# Altium integrated library BYTECH_HW_LIB_2019.IntLib: 907 symbols (part 6 of 6)
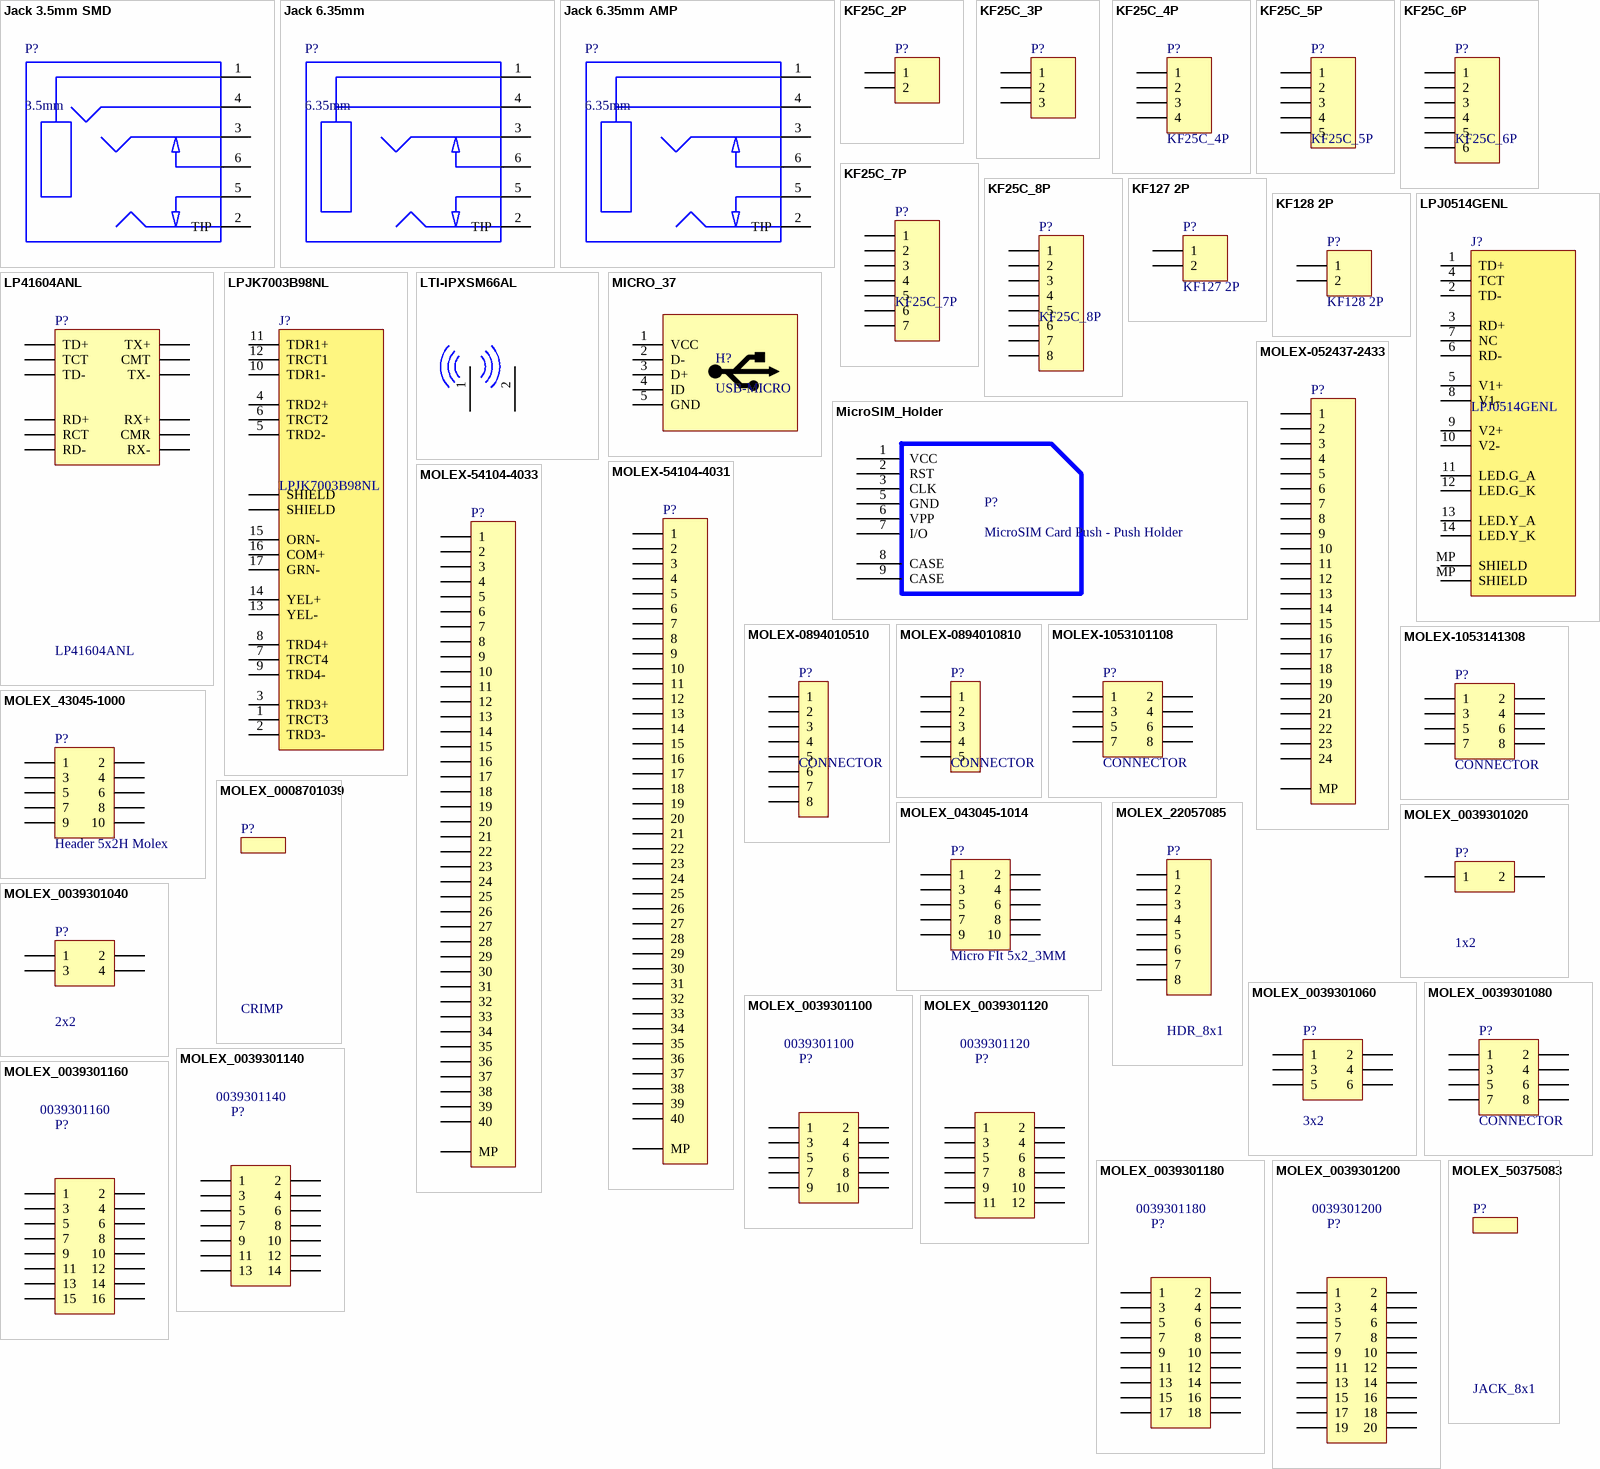
[diagram p44: symbols Jack 3.5mm SMD to MOLEX_50375083]

## MOLEX_0039301060
designator P?, comment 3x2
CONN HEADER R/A 6POS 4.2MM; MFR: MOLEX; MPN: 0039301060; Solder: WAVE; Value: 0039301060
signal-integrity model Connector
footprint CON3X2ANGLE
pins: 1, 2, 3, 4, 5, 6

## MOLEX_0039301080
designator P?, comment CONNECTOR
CONN HEADER R/A 8POS 4.2MM; MFR: MOLEX; MPN: 0039301080; Solder: WAVE; Value: 0039301080
footprint CON4x2Angle
pins: 1, 2, 3, 4, 5, 6, 7, 8

## MOLEX_0039301100
designator P?, comment 0039301100
CONN HEADER R/A 10POS 4.2MM; MFR: MOLEX; Rule: PcbType=ProtelPcb; Solder: WAVE; MPN: 0039301100; Value: 0039301100
footprint CON5x2Angle
pins: 1, 2, 3, 4, 5, 6, 7, 8, 9, 10

## MOLEX_0039301120
designator P?, comment 0039301120
CONN HEADER R/A 12POS 4.2MM; MFR: MOLEX; Rule: PcbType=ProtelPcb; Solder: WAVE; MPN: 0039301120; Value: 0039301120
footprint CON6x2Angle
pins: 1, 2, 3, 4, 5, 6, 7, 8, 9, 10, 11, 12

## MOLEX_0039301140
designator P?, comment 0039301140
CONN HEADER R/A 14POS 4.2MM; MFR: MOLEX; Rule: PcbType=ProtelPcb; Solder: WAVE; MPN: 0039301140; Value: 0039301140
footprint CON7x2Angle (Footprint not found)
pins: 1, 2, 3, 4, 5, 6, 7, 8, 9, 10, 11, 12, 13, 14

## MOLEX_0039301160
designator P?, comment 0039301160
CONN HEADER R/A 16POS 4.2MM; MFR: MOLEX; Rule: PcbType=ProtelPcb; Solder: WAVE; MPN: 0039301160; Value: 0039301160
footprint CON8x2Angle (Footprint not found)
pins: 1, 2, 3, 4, 5, 6, 7, 8, 9, 10, 11, 12, 13, 14, 15, 16

## MOLEX_0039301180
designator P?, comment 0039301180
CONN HEADER R/A 18POS 4.2MM; MFR: MOLEX; Rule: PcbType=ProtelPcb; Solder: WAVE; MPN: 0039301180; Value: 0039301180
footprint CON9x2Angle (Footprint not found)
pins: 1, 2, 3, 4, 5, 6, 7, 8, 9, 10, 11, 12, 13, 14, 15, 16, 17, 18

## MOLEX_0039301200
designator P?, comment 0039301200
CONN HEADER R/A 20POS 4.2MM; MFR: MOLEX; Rule: PcbType=ProtelPcb; Solder: WAVE; MPN: 0039301200; Value: 0039301200
footprint CON10x2Angle (Footprint not found)
pins: 1, 2, 3, 4, 5, 6, 7, 8, 9, 10, 11, 12, 13, 14, 15, 16, 17, 18, 19, 20

## MOLEX_50375083
designator P?, comment JACK_8x1  (mechanical)
CONN HOUSING 8POS 2.5MM SHROUD / (used for 2205-7085); MFR: Molex; MPN: 50375083; Solder: HAND

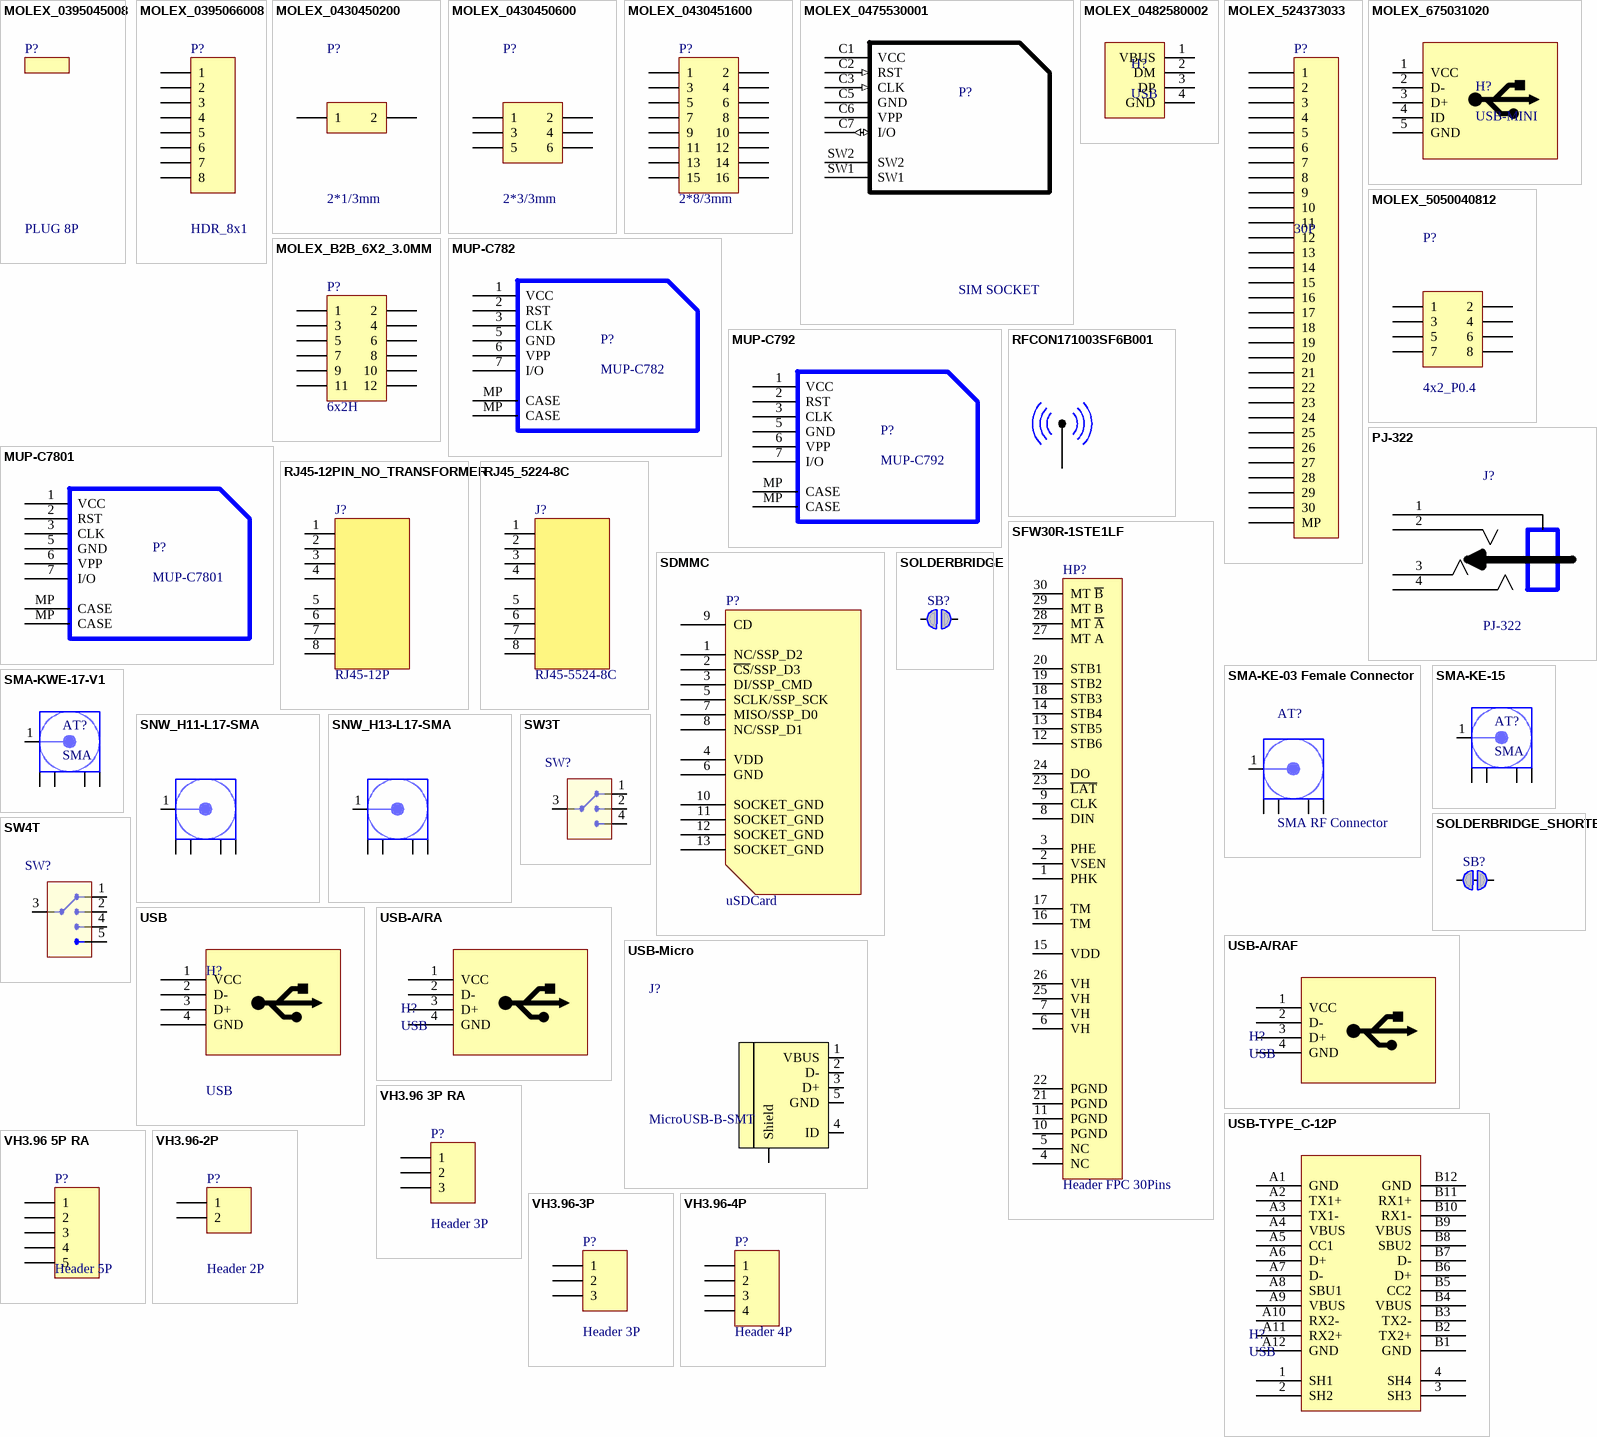
[diagram p34: symbols MOLEX_0395045008 to VH3.96-4P]

## MOLEX_0395045008
designator P?, comment PLUG 8P  (mechanical)
TERM BLOCK PLUG 8POS STR 3.5MM / (used with 0395066008); MFR: Molex; MPN: 0395045008; Solder: MAN

## MOLEX_0395066008
designator P?, comment HDR_8x1
TERM BLOCK HDR 8POS 90DEG 3.5MM; MFR: Molex; MPN: 0395066008; Solder: WAVE
footprint MOLEX_0395066008 (Footprint not found)
pins: 1, 2, 3, 4, 5, 6, 7, 8

## MOLEX_0430450200
designator P?, comment 2*1/3mm
CONN RECEPT 2POS 3mm DUAL ROW; MPN: 0430450200; Solder: WAVE; Value: 2*1/3mm
footprint HDR_1x2_3.0MM
pins: 1, 2

## MOLEX_0430450600
designator P?, comment 2*3/3mm
CONN RECEPT 6POS 3mm DUAL ROW; MPN: 0430450600; Solder: WAVE; Value: 2*3/3mm
footprint HDR_3x2_3.0MM
pins: 1, 2, 3, 4, 5, 6

## MOLEX_0430451600
designator P?, comment 2*8/3mm
CONN RECEPT 16POS 3mm DUAL ROW; MPN: 0430451600; Solder: WAVE; CompanyID: VT-00132; Value: 2*8/3mm
footprint HDR_8X2_3.0MM
pins: 1, 2, 3, 4, 5, 6, 7, 8, 9, 10, 11, 12, 13, 14, 15, 16

## MOLEX_0475530001
designator P?, comment SIM SOCKET
8 (6 + 2) Position Card CONN SIM/SAM CARD PUSH-PULL R/A; MPN: 0475530001; Solder: SMT; CompanyID: VT-01186; Value: SIM SOCKET
footprint 0475530001 (Footprint not found)
pins: C1 VCC (power), C2 RST (in), C3 CLK (in), C5 GND (power), C6 VPP, C7 I/O (io), SW1, SW2

## MOLEX_0482580002
designator H?, comment USB
CONN HEADER RCPT USB 4POS RT ANG T/H; MPN: 482580002; Solder: WAVE; Value: USB
footprint USB_482580002
pins: 1 VBUS, 2 DM, 3 DP, 4 GND

## MOLEX_524373033
designator P?, comment 30P
CONN FFC BOTTOM 30POS 0.50MM R/A; MFR: MOLEX; MPN: 0524373033; Solder: SMT; Value: 30P
footprint MOLEX_0524373033 (Footprint not found)
pins: 0 MP, 1, 2, 3, 4, 5, 6, 7, 8, 9, 10, 11, 12, 13, 14, 15, 16, 17, 18, 19, 20, 21, 22, 23, 24, 25, 26, 27, 28, 29, 30

## MOLEX_675031020
designator H?, comment USB-MINI
CONN RECEPT MINI USB R/A 5POS SMD; MPN: 675031020; Solder: SMT; CompanyID: VT-00344; Value: USB-MINI
footprint USB-Mini
pins: 1 VCC, 2 D-, 3 D+, 4 ID, 5 GND

## MOLEX_5050040812
designator P?, comment 4x2_P0.4
RECP ASSY B-B 0.4 8CKT TP; MPN: 5050040812; Solder: SMT; Value: 4x2_P0.4
footprint 5050040812 (Footprint not found)
pins: 1, 2, 3, 4, 5, 6, 7, 8

## MOLEX_B2B_6X2_3.0MM
designator P?, comment 6x2H
Header, 6-Pin, Dual row, Right Angle, Pitch 3mm; MPN: 43045-1200; CompanyID: VT-01113; Solder: HAND; Value: 6x2H
footprint MOLEX_B2B_6X2_3.0MM
pins: 1, 2, 3, 4, 5, 6, 7, 8, 9, 10, 11, 12

## MUP-C782
designator P?
MicroSIM Card Push - Push Holder; MFR: MUP; MPN: C782; Solder: SMT; Value: MUP-C782
footprint MUP-C782
pins: 1 VCC, 2 RST, 3 CLK, 5 GND, 6 VPP, 7 I/O, MP CASE, MP CASE

## MUP-C792
designator P?
MicroSIM Card Push - Push Holder; MFR: MUP; MPN: C792; Solder: SMT; Value: MUP-C792
footprint MUP-C792 (MicroSIM Card PUSH - PUSH HOLDER)
pins: 1 VCC, 2 RST, 3 CLK, 5 GND, 6 VPP, 7 I/O, MP CASE, MP CASE

## MUP-C7801
designator P?
NanoSIM Card Push - Push Holder; MFR: MUP; MPN: C7801; Solder: SMT; Value: MUP-C7801
footprint MUP-C7801
pins: 1 VCC, 2 RST, 3 CLK, 5 GND, 6 VPP, 7 I/O, MP CASE, MP CASE

## PJ-322
designator J?
Jack Audio 3.5MM PJ-322 5P; BAPartNumber: VT-0; Sold By: SMT; MPN: PJ-322; Value: PJ-322
footprint PJ-322
pins: 1, 2, 3, 4

## RFCON171003SF6B001
designator AT?, comment AT-GSM-GPS  (value not drawn)
CONNECTER ANTENNA GPS GSM; MPN: RFCON171003SF6B001; Solder: HAND; CompanyID: VT-00392; Value: AT-GSM-GPS
footprint ANTENA - SMA2
pins: 1 AT, 2 hidden

## RJ45-12PIN_NO_TRANSFORMER
designator J?, comment RJ45-12P
Solder: WAVE
footprint RJ45-8PIN_18MM_NO_TRANSFORMER
pins: 1, 2, 3, 4, 5, 6, 7, 8

## RJ45_5224-8C
designator J?, comment RJ45-5524-8C
RJ45-12P; Solder: WAVE; MFR_URL: https://vi.aliexpress.com/item/80PCS-x-RJ45-5224-8C-Plastic-PCB-Modular-jack-Network-socket-LAN-CONNECTOR-plug-180degree-top/32722417191.html
footprint RJ45_5224-8C (Footprint not found)
pins: 1, 2, 3, 4, 5, 6, 7, 8

## SDMMC
designator P?, comment uSDCard
Micro SD Card Holder; MFR: GCT; MPN: MEM2055-00-190-01-A
footprint MEM2055-00-190-01-A (Footprint not found)
pins: 1 NC/SSP_D2, 2 ~{CS}/SSP_D3, 3 DI/SSP_CMD, 4 VDD, 5 SCLK/SSP_SCK, 6 GND, 7 MISO/SSP_D0, 8 NC/SSP_D1, 9 CD, 10 SOCKET_GND, 11 SOCKET_GND, 12 SOCKET_GND, 13 SOCKET_GND

## SFW30R-1STE1LF
designator HP?, comment Header FPC 30Pins
FPC 30Pins Pitch 1mm Connector Molex; MPN: SFW30R-1STE1LF; CompanyID: VT-00372; Solder: SMT; Value: Header FPC 30Pins
footprint FPC 30P 1MM (PFC 30Pins Pitch 1mm Connector)
pins: 1 PHK, 2 VSEN, 3 PHE, 4 NC, 5 NC, 6 VH, 7 VH, 8 DIN, 9 CLK, 10 PGND, 11 PGND, 12 STB6, 13 STB5, 14 STB4, 15 VDD, 16 TM, 17 TM, 18 STB3, 19 STB2, 20 STB1, 21 PGND, 22 PGND, 23 ~{LAT}, 24 DO, 25 VH, 26 VH, 27 MT A, 28 MT ~{A}, 29 MT B, 30 MT ~{B}

## SMA-KE-03 Female Connector
designator AT?, comment SMA RF Connector
SMA-KE-03 Female Connector; CompanyID: VT-01109; Solder: WAVE; Value: SMA RF Connector; MFR_URL: http://thegioiic.com/products/sma-ke-03-female-connector
footprint SMA-KE-03 Female Connector
pins: 1 Signal "Signal Pin", 2 (power), 2 (power), 2 (power), 2 (power)

## SMA-KE-15
designator AT?, comment SMA
MPN: SMA-KE-15; Solder: WAVE; MFR_URL: https://detail.tmall.com/item.htm?spm=a230r.1.14.22.507e4d4blv2K4G&id=544393214226&ns=1&abbucket=6
footprint SMA-KE-15
pins: 1 Signal "Signal Pin", 2 (power), 2 (power), 2 (power), 2 (power)

## SMA-KWE-17-V1
designator AT?, comment SMA
MPN: SMA-KWE-17-V1; Solder: WAVE
footprint SMA-KWE-17-V1
pins: 1 Signal "Signal Pin", 2 (power), 2 (power), 2 (power), 2 (power)

## SNW_H11-L17-SMA
designator AT?, comment AT-GSM-GPS  (value not drawn)
CONNECTER ANTENNA GPS GSM; MPN: SNW_H11-L17-SMA; MFR: Sunny Way; Solder: HAND; Value: AT-GSM-GPS
footprint SNW_H11-L17-SMA (Footprint not found)
pins: 1 Signal "Signal Pin", 2 hidden, 2 (power), 2 (power), 2 (power), 2 (power)

## SNW_H13-L17-SMA
designator AT?, comment AT-GSM-GPS  (value not drawn)
CONNECTER ANTENNA GPS GSM; MPN: SNW_H13-L17-SMA; MFR: Sunny Way; Solder: HAND; Value: AT-GSM-GPS
footprint SNW_H13-L17-SMA (Footprint not found)
pins: 1 Signal "Signal Pin", 2 hidden, 2 (power), 2 (power), 2 (power), 2 (power)

## SOLDERBRIDGE
designator SB?, comment Solderbridge  (value not drawn)  (no BOM)
Artikkelnr Noca: N.A.; Part Number: Solderbridge; Manufacturer: *; Manufacturer Part Number: *; Footprint Doc: Solderbridge; LatestRevisionDate: 2009-12-14; Pin Count: 2; Publisher: Nordic Semiconductor; Published: 2009-12-14; Value: Solderbridge; Note: *; Supplier: *; Supplier part number: *; 2nd source Supplier: *; 2nd source part number: *; Artikkelnr Simpro: N.A.; ComponentLink1Description: Datasheet; ComponentLink1URL: *; ComponentLink2Description: Supplier link; ComponentLink2URL: *; HelpURL: *
footprint Solderbridge
pins: 1 0, 2 1

## SOLDERBRIDGE_SHORTED
designator SB?, comment Solderbridge  (value not drawn)  (net tie, no BOM)
Shorted Solderbridge; Part Number: Solderbridge Shorted; Artikkelnr Noca: N.A.; Manufacturer: *; Manufacturer Part Number: *; Footprint Doc: Solderbridge_Shorted; LatestRevisionDate: 2012-08-07; Pin Count: 2; Publisher: Nordic Semiconductor; Published: 2012-08-07; Value: Solderbridge; Note: *; Supplier: *; Supplier part number: *; 2nd source Supplier: *; 2nd source part number: *; Artikkelnr Simpro: N.A.; ComponentLink1Description: Datasheet; ComponentLink1URL: *; ComponentLink2Description: Supplier link; ComponentLink2URL: *; HelpURL: *
footprint Solderbridge_Shorted
pins: 1 0, 2 1

## SW3T
designator SW?, comment SLIDE  (value not drawn)
SWITCH SLIDE SP3T 300MA 30V; MPN: MSK-13D19; MFR: China
footprint MSK-13D19
pins: 1, 2, 3, 4

## SW4T
designator SW?, comment SLIDE  (value not drawn)
SWITCH SLIDE SP4T 300MA 30V; MPN: SK-14D07-VG 6; MFR: C&K
footprint SK-14D07-VG 6
pins: 1, 2, 3, 4, 5

## USB
designator H?
footprint USB-B-STRANGE (USB Type B - STRANGE - Slave Device)
pins: 1 VCC, 2 D-, 3 D+, 4 GND, 5 hidden, 6 hidden

## USB-A/RA
designator H?, comment USB
USB A/RA Type
footprint USB-A-DEVICE-RA (USB Type A)
pins: 1 VCC, 2 D-, 3 D+, 4 GND

## USB-A/RAF
designator H?, comment USB
USB A/RA Type
footprint USB-A-HOST-RA
footprint USB-A-HOST-ST
pins: 1 VCC, 2 D-, 3 D+, 4 GND

## USB-Micro
designator J?, comment MicroUSB-B-SMT
MPN: FCI 10118193-0001LF; MFR: Amphenol FCI
footprint USB - MicroUSB MK5P DIP
pins: 1 VBUS (power), 2 D-, 3 D+, 4 ID, 5 GND (power), 6 Shield (power)

## USB-TYPE_C-12P
designator H?, comment USB
USB-TYPE_C-12P
footprint USB-TYPE-C-12P (Footprint not found)
pins: 1 SH1, 2 SH2, 3 SH3, 4 SH4, A1 GND, A2 TX1+, A3 TX1-, A4 VBUS, A5 CC1, A6 D+, A7 D-, A8 SBU1, A9 VBUS, A10 RX2-, A11 RX2+, A12 GND, B1 GND, B2 TX2+, B3 TX2-, B4 VBUS, B5 CC2, B6 D+, B7 D-, B8 SBU2, B9 VBUS, B10 RX1-, B11 RX1+, B12 GND

## VH3.96 3P RA
designator P?, comment Header 3P
CONN HEADER R/A 3POS 3.96MM; MPN: B3PS-VH(LF)(SN); MFR: JST Sales America Inc.; Solder: WAVE; Value: Header 3P
footprint VH3.96 3P RA (Connector; Header; 5 Position)
pins: 1, 2, 3

## VH3.96 5P RA
designator P?, comment Header 5P
CONN HEADER R/A 5POS 3.96MM; MPN: B5PS-VH(LF)(SN); MFR: JST Sales America Inc.; CompanyID: VT-00125; Solder: WAVE; Value: Header 5P
footprint VH3.96 5P RA (Connector; Header; 5 Position)
pins: 1, 2, 3, 4, 5

## VH3.96-2P
designator P?, comment Header 2P
Header, 2 Pin Pitch 3.96mm; MPN: VH3.96-2P; Solder: WAVE; Value: Header 2P
footprint VH3.96-2P (Footprint not found)
pins: 1, 2

## VH3.96-3P
designator P?, comment Header 3P
Header, 3 Pin Pitch 3.96mm; MPN: VH3.96-3P; Solder: WAVE; Value: Header 3P
footprint VH3.96-3P (Footprint not found)
pins: 1, 2, 3

## VH3.96-4P
designator P?, comment Header 4P
Header, 4 Pin Pitch 3.96mm; MPN: VH3.96-4P; Solder: WAVE; Value: Header 4P
footprint VH3.96-4P (Footprint not found)
pins: 1, 2, 3, 4

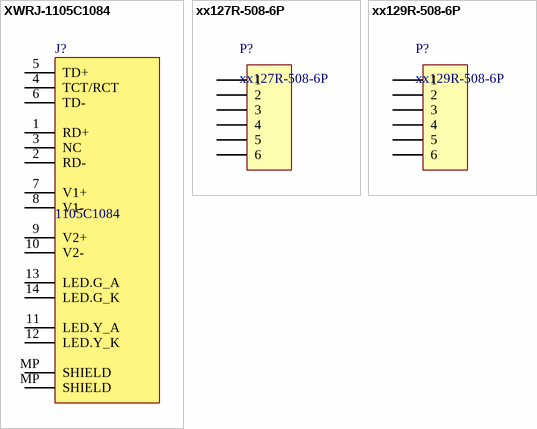
[diagram p35: symbols XWRJ-1105C1084 to xx129R-508-6P]

## XWRJ-1105C1084
designator J?, comment 1105C1084
XW-ETLINK 1105C1084 RJ-45 Connector; MPN: XWRJ-1105C1084; Solder: WAVE; MFR: XW-ETLINK; Value: 1105C1084
footprint 1105C1084 (Footprint not found)
pins: 1 RD+, 2 RD-, 3 NC, 4 TCT/RCT, 5 TD+, 6 TD-, 7 V1+, 8 V1-, 9 V2+, 10 V2-, 11 LED.Y_A, 12 LED.Y_K, 13 LED.G_A, 14 LED.G_K, MP SHIELD, MP SHIELD

## xx127R-508-6P
designator P?
footprint xx127R-508-6P
pins: 1, 2, 3, 4, 5, 6

## xx129R-508-6P
designator P?
footprint xx129R-508-6P
pins: 1, 2, 3, 4, 5, 6


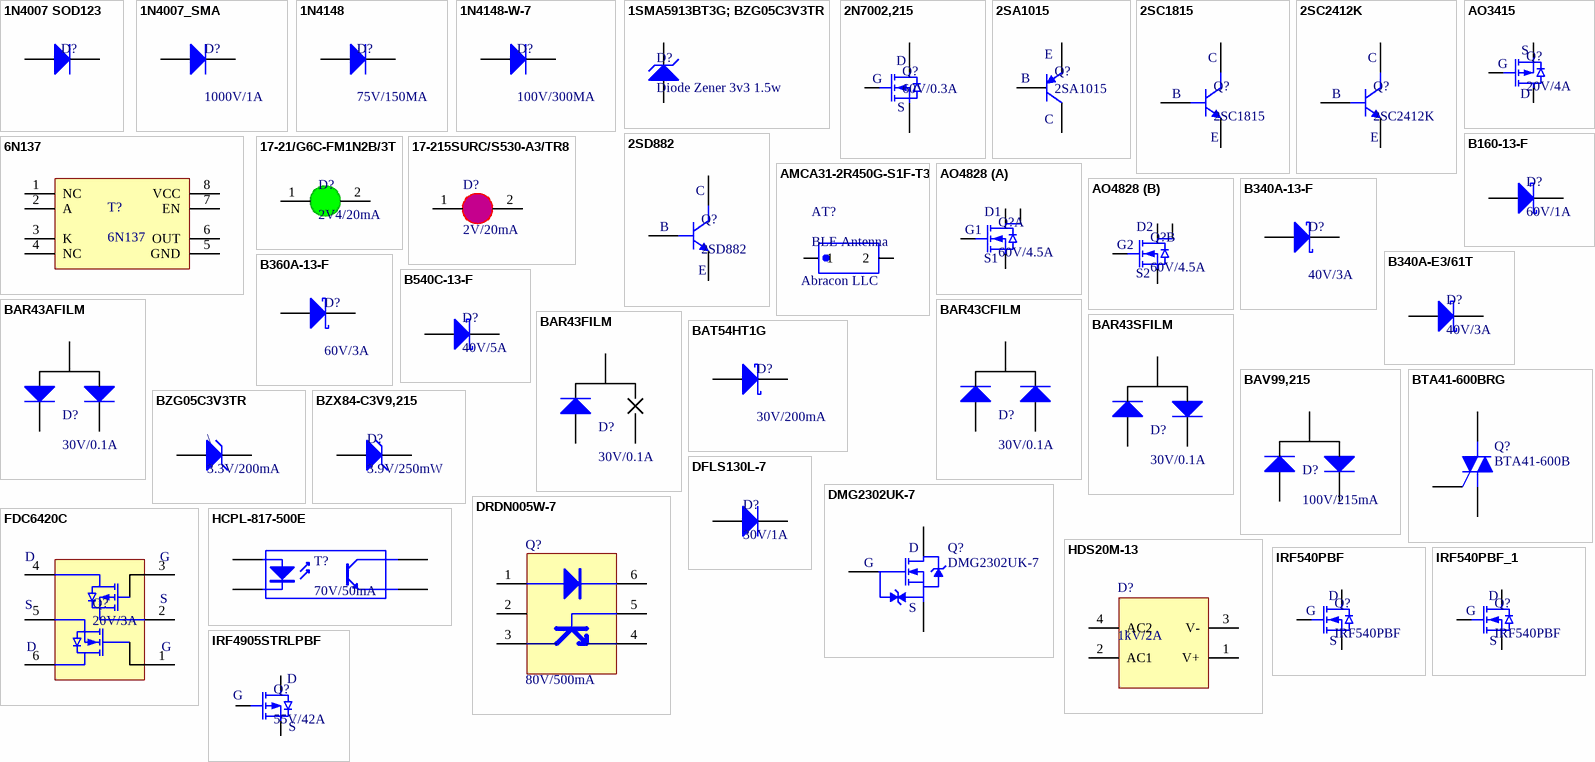
[diagram p36: symbols 1N4007 SOD123 to IRF4905STRLPBF]

## 1N4007 SOD123
designator D?
footprint SOD123
pins: 1 A, 2 K

## 1N4007_SMA
designator D?, comment 1000V/1A
DIODE GEN PURP 1KV 1A SMA; MPN: MRA4007T3G; Solder: SMT; Value: 1000V/1A; MFR: *
footprint DIODE_DO214AC_SMA (Diode 2214AC)
pins: 1 A, 2 K

## 1N4148
designator D?, comment 75V/150MA
DIODE GEN PURP 75V 150MA DO35; MPN: 1N4148; Solder: WAVE; CompanyID: VT-00238; Value: 75V/150MA
footprint DIODE_DO35
pins: 1 A, 2 K

## 1N4148-W-7
designator D?, comment 100V/300MA
DIODE GEN PURP 100V 300MA SOD123; MPN: 1N4148W-7-F; MFR: Diodes Incorporated; Solder: SMT; Value: 100V/300MA
footprint SOD-123 (SOD123, 2-Leads, Body 2.6x1.6mm, Pitch 3.05mm, IPC High Density)
pins: 1 A, 2 K

## 1SMA5913BT3G; BZG05C3V3TR
designator D?, comment Diode Zener 3v3 1.5w
DIODE ZENER 3.3V 1.5W SMA, DO-214AC; MPN: 1SMA5913BT3G; Solder: SMT; CompanyID: VT-00944; Value: Diode Zener 3v3 1.5w
footprint DIODE_DO214AC_SMA (Diode 2214AC- SMA type)
pins: 1 A, 2 K

## 2N7002,215
designator Q?, comment 60V/0.3A
MOSFET N-CH 60V 300MA SOT-23; MPN: 2N7002,215; Solder: SMT; CompanyID: VT-00926; Value: 60V/0.3A
footprint SOT23_3 (SOT23, 3-Leads, Body 2,90x2,30mm, Pitch 0,95mm, IPC Medium Density)
pins: 1 G, 2 S, 3 D

## 2SA1015
designator Q?
TRANS PNP 20V 0.15A 50V SOT23; Solder: SMT; MPN: 2SA1015; Value: 2SA1015
footprint SOT23_3 (SOT23, 3-Leads, Body 2,90x2,30mm, Pitch 0,95mm, IPC Medium Density)
pins: 1 B, 2 E, 3 C

## 2SC1815
designator Q?
TRANS NPN 50V 0.15A SOT23-3; Solder: SMT; MPN: 2SC1815; Value: 2SC1815
footprint SOT23_3 (SOT23, 3-Leads, Body 2,90x2,30mm, Pitch 0,95mm, IPC Medium Density)
pins: 1 B, 2 E, 3 C

## 2SC2412K
designator Q?
TRANS NPN 50V 0.15A SOT-346; Solder: SMT; MPN: 2SC2412K; Value: 2SC2412K
footprint SOT23_3 (SOT23, 3-Leads, Body 2,90x2,30mm, Pitch 0,95mm, IPC Medium Density)
pins: 1 B, 2 E, 3 C

## 2SD882
designator Q?
TRANS NPN 40V 3A SOT89; Solder: SMT; MPN: 2SD882; Value: 2SD882
footprint SOT89-150P350X160-3M (SOT89, 3-Leads, Body 4.50x2.50mm, Pitch 1.50mm, Lead Span 3.5mm, IPC Low Density)
pins: 1 B, 2 C, 3 E

## 6N137
designator T?
OPTOISO 5KV 1CH OPEN COLL 8DIP; MFR: Lite-On Inc.; Solder: SMT; Value: 6N137; MPN: 6N137; PinCount: 8
footprint DIP100/8/W300/L400 (Footprint not found)
pins: 1 NC, 2 A, 3 K, 4 NC, 5 GND, 6 OUT, 7 EN, 8 VCC

## 17-21/G6C-FM1N2B/3T
designator D?, comment 2V4/20mA
LED GREEN CLEAR 2V4 20mA 0805 SMD; MPN: 17-21/G6C-FM1N2B/3T; CompanyID: VT-00393; Solder: SMT; Value: 2V4/20mA
footprint LED_0805_GREEN (LED SMD; Body 2.0 x 1.3 mm (LxW typ))
pins: 1 A, 2 K

## 17-215SURC/S530-A3/TR8
designator D?, comment 2V/20mA
LED RED CLEAR 0805 SMD; MPN: 17-215SURC/S530-A3/TR8; Solder: SMT; CompanyID: VT-00379; Value: 2V/20mA
footprint LED_0805_BLUE (Chip Resistor; Body 2.0 x 1.3 mm (LxW typ))
footprint LED_0805_RED (Chip Resistor; Body 2.0 x 1.3 mm (LxW typ))
footprint LED_0805_GREEN (Chip Resistor; Body 2.0 x 1.3 mm (LxW typ))
pins: 1 A, 2 K

## AMCA31-2R450G-S1F-T3
designator AT?, comment BLE Antenna  MFR: Abracon LLC
RF ANT 2.4GHZ CHIP SOLDER SMD; MPN: AMCA31-2R450G-S1F-T3
footprint 3216 Antenna
pins: 1, 2

## AO3415
designator Q?, comment 20V/4A
MOSFET P-CH 20V 4A SOT23; MPN: AO3415; MFR: Alpha & Omega Semiconductor Inc.; Solder: SMT; Value: 20V/4A
footprint SOT23_3 (SOT23, 3-Leads, Body 2,90x2,30mm, Pitch 0,95mm, IPC Medium Density)
pins: 1 G, 2 S, 3 D

## AO4828
designator Q?, comment 60V/4.5A
MOSFET 2N-CH 60V 4.5A 8-SOIC; MPN: AO4828; MFR: Alpha & Omega Semiconductor Inc.; Solder: SMT; Value: 60V/4.5A
footprint SOIC-8
part A pins: 3 S1, 4 G1, 5 D1, 6 D1
part B pins: 1 S1, 2 G1, 7 D2, 8 D2
part B text: G2; S2

## B160-13-F
designator D?, comment 60V/1A
DIODE SCHOTTKY 60V 1A SMA DO-214A; MPN: B160-13-F; CompanyID: VT-00897; Solder: SMT; Value: 60V/1A; MFR: *
footprint DIODE_DO214AC_SMA (Diode 2214AC)
pins: 1 A, 2 K

## B340A-13-F
designator D?, comment 40V/3A
DIODE SCHOTTKY 40V 3A SMA; MPN: B340A-13-F; Solder: SMT; CompanyID: VT-00025; Value: 40V/3A; MFR: *
footprint DIODE_DO214AC_SMA (Diode 2214AC)
pins: 1 A, 2 K

## B340A-E3/61T
designator D?, comment 40V/3A
DIODE SCHOTTKY 40V 3A DO214AC; MPN: B340A-E3/61T; Solder: SMT; CompanyID: VT-01266; Value: 40V/3A
footprint DIODE_DO214AC_SMA (Diode 2214AC)
pins: 1 A, 2 K

## B360A-13-F
designator D?, comment 60V/3A
DIODE SCHOTTKY 60V 3A SMA; MPN: B360A-13-F; Solder: SMT; Value: 60V/3A; MFR: *
footprint DIODE_DO214AC_SMA (Diode 2214AC)
pins: 1 A, 2 K

## B540C-13-F
designator D?, comment 40V/5A
DIODE SCHOTTKY 40V 5A SMC; MPN: B540C-13-F; CompanyID: VT-00370; Solder: SMT; Value: 40V/5A
footprint DIODE_DO214AB_SMC (SMC Type)
pins: 1 A, 2 K

## BAR43AFILM
designator D?, comment 30V/0.1A
DIODE ARRAY SCHOTTKY 30V SOT23-3; MPN: BAR43AFILM; MFR: STMicroelectronics; Solder: SMT; Value: 30V/0.1A
footprint SOT23_3 (SOT23, 3-Leads, Body 2,90x2,30mm, Pitch 0,95mm, IPC Medium Density)
pins: 1, 2, 3

## BAR43CFILM
designator D?, comment 30V/0.1A
DIODE ARRAY SCHOTTKY 30V SOT23-3; MPN: BAR43CFILM; MFR: STMicroelectronics; Solder: SMT; Value: 30V/0.1A
footprint SOT23_3 (SOT23, 3-Leads, Body 2,90x2,30mm, Pitch 0,95mm, IPC Medium Density)
pins: 1, 2, 3

## BAR43FILM
designator D?, comment 30V/0.1A
DIODE ARRAY SCHOTTKY 30V SOT23-3; MPN: BAR43FILM; MFR: STMicroelectronics; Solder: SMT; Value: 30V/0.1A
footprint SOT23_3 (SOT23, 3-Leads, Body 2,90x2,30mm, Pitch 0,95mm, IPC Medium Density)
pins: 1, 2, 3

## BAR43SFILM
designator D?, comment 30V/0.1A
DIODE ARRAY SCHOTTKY 30V SOT23-3; MPN: BAR43SFILM; MFR: STMicroelectronics; Solder: SMT; Value: 30V/0.1A
footprint SOT23_3 (SOT23, 3-Leads, Body 2,90x2,30mm, Pitch 0,95mm, IPC Medium Density)
pins: 1, 2, 3

## BAT54HT1G
designator D?, comment 30V/200mA
DIODE SCHOTTKY 30V 200MA SOD323; MPN: BAT54HT1G; Solder: SMT; CompanyID: VT-01362; Value: 30V/200mA
footprint SOD-323 (diode)
pins: 1 A, 2 K

## BAV99,215
designator D?, comment 100V/215mA
DIODE ARRAY GP 100V 215MA SOT23; MPN: BAV99,215; CompanyID: VT-00208; Solder: SMT; Value: 100V/215mA
footprint SOT23_3 (SOT23, 3-Leads, Body 2,90x2,30mm, Pitch 0,95mm, IPC Medium Density)
pins: 1, 2, 3

## BTA41-600BRG
designator Q?, comment BTA41-600B
TRIAC 600V 40A TOP3; Manufacturer: STMicroelectronics; Manufacturer Part Number: BTA41-600BRG; BAPartNumber: VT-xxx; SOLD_BY: WAVE; Value: BTA41-600B
footprint TO247+LageHeatsink
pins: 1 M1, 2 M2, 3 G

## BZG05C3V3TR
designator \, comment 3.3V/200mA
DIODE ZENER 3.3V 1.25W 200mA  DO214AC; MPN: BZG05C3V3TR; CompanyID: VT-00944; Solder: SMT; Value: 3.3V/200mA
footprint DIODE_DO214AC_SMA (Diode 2214AC)
pins: 1 A, 2 K

## BZX84-C3V9,215
designator D?, comment 3.9V/250mW
DIODE ZENER 3.9V 250MW SOT23; MPN: BZX84-C3V9,215; Solder: SMT; CompanyID: VT-00751; Value: 3.9V/250mW
footprint SOT23_3 (SOT23, 3-Leads, Body 2,90x2,30mm, Pitch 0,95mm, IPC Medium Density)
pins: 1 A, 2 K

## DFLS130L-7
designator D?, comment 30V/1A
DIODE SCHOTTKY 30V 1A POWERDI123; MPN: DFLS130L-7; CompanyID: VT-00057; Solder: SMT; Value: 30V/1A
footprint DIODE_DFLS130L
pins: 1 A, 2 K

## DMG2302UK-7
designator Q?
MOSFET N-CH 20V 2.8A SOT23; MFR: Diodes Incorporated; Solder: SMT; MPN: DMG2302UK-7; Value: DMG2302UK-7; Category: Transistor; PinCount: 3
footprint SOT23_3 (SOT23, 3-Leads, Body 2,90x2,30mm, Pitch 0,95mm, IPC Medium Density)
pins: 1 G, 2 S, 3 D

## DRDN005W-7
designator Q?, comment 80V/500mA
TRANS NPN 80V 0.5A SOT363; MPN: DRDN005W-7; CompanyID: VT-00091; Solder: SMT; Value: 80V/500mA
footprint SOT363 (Small Outline Transistor (SOT23), 0.65 mm pitch; 6 pin, 2.00 mm L X 1.25 mm W X 1.10 mm H body)
pins: 1, 2, 3, 4, 5, 6

## FDC6420C
designator Q?, comment 20V/3A
MOSFET N/P-CH 20V 3A/2.2A SSOT-6; MPN: FDC6420C; CompanyID: VT-00922; Solder: SMT; Value: 20V/3A
footprint SOT23-6 (SOT23, 6-Leads, Body 3.03x2.84mm, Pitch 0.95mm, IPC Medium Density)
pins: 1, 2, 3, 4, 5, 6
text: D; G; S

## HCPL-817-500E
designator T?, comment 70V/50mA
OPTOISOLATOR 5KV TRANSISTOR 4SMD; MPN: HCPL-817-500E; Solder: SMT; CompanyID: VT-00147; Value: 70V/50mA
footprint OPTO TRANSISTOR_SMD-4
pins: 1, 2, 3, 4

## HDS20M-13
designator D?, comment 1kV/2A
BRIDGE RECT 1PHASE 1KV 2A HDS; MPN: HDS20M-13; Solder: SMT; Value: 1kV/2A; MFR: *
footprint DIODE_Bridge SMD
pins: 1 V+, 2 AC1, 3 V-, 4 AC2

## IRF540PBF
designator Q?
MOSFET N-CH 100V 28A TO-220AB; Solder: WAVE; Value: IRF540PBF; MPN: IRF540PBF; CompanyID: *
pins: 1 G, 2 D, 3 S

## IRF540PBF_1
designator Q?, comment IRF540PBF
MOSFET N-CH 100V 28A TO-220AB; Solder: WAVE; Value: IRF540PBF; MPN: IRF540PBF; CompanyID: *
pins: 1 G, 2 D, 3 S

## IRF4905STRLPBF
designator Q?, comment 55V/42A
MOSFET P-CH 55V 42A D2PAK; MPN: IRF4905STRLPBF; CompanyID: VT-00834; Solder: SMT; Value: 55V/42A
footprint TO263_3 (DPAK, 5.08 mm pitch; 2 pin, 9.08 mm L X 10.16 mm W X 4.80 mm H body)
pins: 1 G, 2 S, 3 D

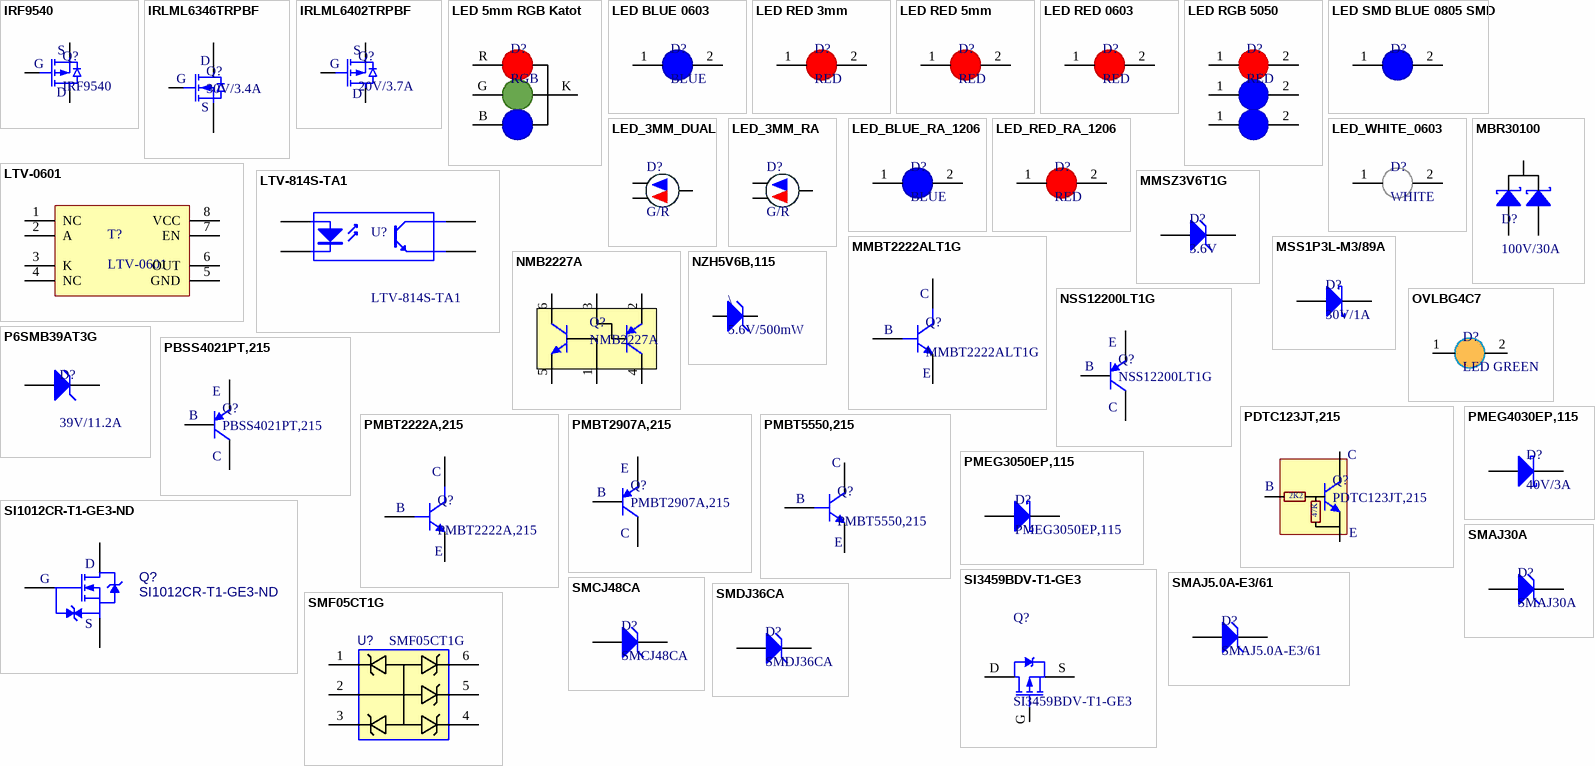
[diagram p37: symbols IRF9540 to SMF05CT1G]

## IRF9540
designator Q?
MOSFET P-CH 100V 19A TO-220AB; Solder: WAVE; CompanyID: *; MPN: IRF9540; Value: IRF9540
pins: 1 G, 2 D, 3 S

## IRLML6346TRPBF
designator Q?, comment 30V/3.4A
MOSFET N-CH 30V 3.4A SOT23; MPN: IRLML6346TRPBF; MFR: Infineon Technologies; Solder: SMT; Value: 30V/3.4A
footprint SOT23_3 (SOT23, 3-Leads, Body 2,90x2,30mm, Pitch 0,95mm, IPC Medium Density)
pins: 1 G, 2 S, 3 D

## IRLML6402TRPBF
designator Q?, comment 20V/3.7A
MOSFET P-CH 20V 3.7A SOT-23; MPN: IRLML6402TRPBF; Solder: SMT; CompanyID: VT-00532; Value: 20V/3.7A
footprint SOT23_3 (SOT23, 3-Leads, Body 2,90x2,30mm, Pitch 0,95mm, IPC Medium Density)
pins: 1 G, 2 S, 3 D

## LED 5mm RGB Katot
designator D?, comment RGB
LED 5mm RGB Katot; Solder: WAVE; MPN: http://linhkienchatluong.vn/led-don-f5-5mm/led-5mm-rgb-trang-duc-k-chung_sp697_ct4454.aspx; Value: RGB; Category: *
footprint LED_5MM_RGB Katot
pins: B A, G A, K, R A

## LED BLUE 0603
designator D?, comment BLUE
LED BLUE 0603 SMD; Solder: SMT; Value: BLUE; Category: *
footprint LED_0603_BLUE (LED SMD; Body 1.6 x 0.8 mm (LxW typ))
pins: 1 A, 2 K

## LED RED 3mm
designator D?, comment RED
LED RED 3MM; Solder: WAVE; Value: RED; Category: *
footprint LED_3MM-RED (LED RED 3MM T/H)
pins: 1 A, 2 K

## LED RED 5mm
designator D?, comment RED
LED RED 5mm; Solder: WAVE; Value: RED; Category: *
footprint LED_5MM
pins: 1 A, 2 K

## LED RED 0603
designator D?, comment RED
LED RED 0603 SMD; Solder: SMT; Value: RED; Category: *
footprint LED_0603_RED (LED SMD; Body 1.6 x 0.8 mm (LxW typ))
pins: 1 A, 2 K

## LED RGB 5050
designator D?, comment RED
LED RED 5mm; Solder: WAVE; Value: RED; Category: *
footprint LED_RGB_5050 (Footprint not found)
pins: 1 A, 1 A, 1 A, 2 K, 2 K, 2 K

## LED SMD BLUE 0805 SMD
designator D?
LED BLUE 0805 SMD; CompanyID: VT-01311; Solder: SMT; Category: *
footprint LED_0805_BLUE (LED SMD; Body 2.0 x 1.3 mm (LxW typ))
pins: 1 A, 2 K

## LED_3MM_DUAL
designator D?, comment G/R
LED BLUE/RED DIFFUSED T-1 T/H 3MM; MFR: SunLED; MPN: XLMDKCBD34M; Solder: WAVE; Value: B/R LED; Category: Optoelectronics; PinCount: 3
footprint LED_3MM_DUALCOLOR
pins: 1 KR, 2 A, 3 KB

## LED_3MM_RA
designator D?, comment G/R
LED BLUE/RED DIFFUSED T-1 T/H 3MM; MFR: SunLED; MPN: XLMDKCBD34M; Solder: WAVE; Value: B/R LED; Category: Optoelectronics; PinCount: 3; URL: https://item.taobao.com/item.htm?spm=a230r.1.14.6.66213402V6WLYs&id=605186082192&ns=1&abbucket=1#detail
footprint LED_3MM_DUAL RA
pins: 1 KR, 2 A, 3 KB

## LED_BLUE_RA_1206
designator D?, comment BLUE
footprint LED_1206_SIDEVIEW_BLUE
pins: 1 A, 2 K

## LED_RED_RA_1206
designator D?, comment RED
footprint LED_1206_SIDEVIEW_RED
pins: 1 A, 2 K

## LED_WHITE_0603
designator D?, comment WHITE
Value: WHITE
footprint LED_0603_WHITE (LED SMD; Body 1.6 x 0.8 mm (LxW typ))
pins: 1 A, 2 K

## LTV-0601
designator T?
OPTOISO 3.75KV OPN COLLECTOR 8SO; MFR: Lite-On Inc.; Solder: SMT; Value: LTV-0601; MPN: LTV-0601; PinCount: 8
footprint DMP8 (TSOP, 8-Leads, Body 5.00x5.00mm, Pitch 1.27mm, IPC Medium Density)
pins: 1 NC, 2 A, 3 K, 4 NC, 5 GND, 6 OUT, 7 EN, 8 VCC

## LTV-814S-TA1
designator U?
OPTOISOLATR 5KV TRANSISTOR 4-SMD; MFR: Lite-On Inc.; Solder: SMT; MPN: LTV-814S-TA1; Value: LTV-814S-TA1
footprint OPTO TRANSISTOR_SMD-4
pins: 1, 2, 3, 4

## MBR30100
designator D?, comment 100V/30A
MBR30100 Diode Schottky 30A 100V TO-220; Solder: WAVE; Value: 100V/30A; MPN: MBR30100; Category: DIODE
footprint TO220
pins: 1 A1, 2 K, 3 A2

## MMBT2222ALT1G
designator Q?
TRANS NPN 40V 0.6A SOT23; Solder: SMT; MPN: MMBT2222ALT1G; Value: MMBT2222ALT1G
footprint SOT23_3 (SOT23, 3-Leads, Body 2,90x2,30mm, Pitch 0,95mm, IPC Medium Density)
pins: 1 B, 2 E, 3 C

## MMSZ3V6T1G
designator D?, comment 3.6V
DIODE ZENER 3.6V 500MW SOD123; MPN: MMSZ3V6T1G; MFR: ON; Solder: SMT; Value: 3.6V
footprint SOD-123 (SOD123, 2-Leads, Body 2.6x1.6mm, Pitch 3.05mm, IPC High Density)
pins: 1 A, 2 K

## MSS1P3L-M3/89A
designator D?, comment 30V/1A
DIODE SCHOTTKY 30V 1A MICROSMP; MPN: MSS1P3L-M3/89A; Solder: SMT; CompanyID: VT-01279; Value: 30V/1A
pins: 1 A, 2 K

## NMB2227A
designator Q?
TRANS PREBIAS NPN 250MW TO236AB; MFR: NXP Semiconductors; Solder: SMT; Value: NMB2227A; MPN: NMB2227A
pins: 1 B1, 2 E2, 3 B2, 4 C2, 5 E1, 6 C1

## NSS12200LT1G
designator Q?
TRANS BIPOLAR PNP 12V 2A SOT-23; Solder: SMT; CompanyID: VT-00380; MPN: NSS12200LT1G; Value: NSS12200LT1G
footprint SOT23_3 (SOT23, 3-Leads, Body 2,90x2,30mm, Pitch 0,95mm, IPC Medium Density)
pins: 1 B, 2 E, 3 C

## NZH5V6B,115
designator \, comment 5.6V/500mW
DIODE ZENER 5.6V 500MW SOD123F; MPN: NZH5V6B,115; Solder: SMT; Value: 5.6V/500mW
footprint DIODE_SOD-123 (DIODE_DO35)
pins: 1 A, 2 K

## OVLBG4C7
designator D?, comment LED GREEN
LED GREEN CLEAR 3MM ROUND T/H; MPN: OVLBG4C7; Solder: WAVE; CompanyID: VT-00315; Value: LED GREEN
footprint LED_3MM-GREEN
pins: 1 A, 2 K

## P6SMB39AT3G
designator D?, comment 39V/11.2A
TVS DIODE 39V  600W SMB; MPN: P6SMB39AT3G; Solder: SMT; CompanyID: VT-00089; Value: 39V/11.2A
footprint DIODE_DO214AA_SMB
pins: 1 A, 2 K

## PBSS4021PT,215
designator Q?
TRANS PNP 20V 3.5A SOT23; Solder: SMT; CompanyID: VT-00380; MPN: PBSS4021PT,215; Value: PBSS4021PT,215
footprint SOT23_3 (SOT23, 3-Leads, Body 2,90x2,30mm, Pitch 0,95mm, IPC Medium Density)
pins: 1 B, 2 E, 3 C

## PDTC123JT,215
designator Q?
TRANS PREBIAS NPN 250MW TO236AB; Solder: SMT; CompanyID: VT-00921; Value: PDTC123JT,215; MPN: PDTC123JT,215
footprint SOT23_3 (SOT23, 3-Leads, Body 2,90x2,30mm, Pitch 0,95mm, IPC Medium Density)
pins: 1 B, 2 E, 3 C
text: 2K2; 47K

## PMBT2222A,215
designator Q?
TRANS NPN 40V 0.6A SOT23; Solder: SMT; CompanyID: VT-00141; MPN: PMBT2222A,215; Value: PMBT2222A,215
footprint SOT23_3 (SOT23, 3-Leads, Body 2,90x2,30mm, Pitch 0,95mm, IPC Medium Density)
pins: 1 B, 2 E, 3 C

## PMBT2907A,215
designator Q?
TRANS PNP 60V 0.6A SOT23; CompanyID: VT-00143; Solder: SMT; Value: PMBT2907A,215; MPN: PMBT2907A,215
footprint SOT23_3 (SOT23, 3-Leads, Body 2,90x2,30mm, Pitch 0,95mm, IPC Medium Density)
pins: 1 B, 2 E, 3 C

## PMBT5550,215
designator Q?
TRANS NPN 140V 0.3A SOT23; CompanyID: VT-01086; Solder: SMT; MPN: PMBT5550,215; Value: PMBT5550,215
footprint SOT23_3 (SOT23, 3-Leads, Body 2,90x2,30mm, Pitch 0,95mm, IPC Medium Density)
pins: 1 B, 2 E, 3 C

## PMEG3050EP,115
designator D?
DIODE SCHOTTKY 30V 5A SOD128; Solder: SMT; CompanyID: VT-01138; MPN: PMEG3050EP,115; Value: PMEG3050EP,115
footprint SOD128 (SODFL, 2-Leads, Body 3.63x4.70mm, IPC Medium Density)
pins: 1 A, 2 K

## PMEG4030EP,115
designator D?, comment 40V/3A
DIODE SCHOTTKY 40V 3A SOD128; MPN: PMEG4030EP,115; MFR: Nexperia USA Inc.; Solder: SMT; Value: 40V/3A; PinCount: 2
footprint SOD128 (SODFL, 2-Leads, Body 3.63x4.70mm, IPC Medium Density)
pins: 1 A, 2 K

## SI1012CR-T1-GE3-ND
designator Q?
MOSFET N-CH 20V 0.63A SC-75A; Solder: SMT; CompanyID: VT-01313; MPN: SI1012CR-T1-GE3-ND; Value: SI1012CR-T1-GE3-ND
footprint SOT-416 (NXP recommended footprint.)
pins: 1 G, 2 S, 3 D

## SI3459BDV-T1-GE3
designator Q?
MOSFET P-CH 60V 2.9A 6-TSOP; CompanyID: VT-01031; Solder: SMT; Value: SI3459BDV-T1-GE3; MPN: SI3459BDV-T1-GE3
footprint TSOP-6 - duplicate (TSOP, 6-Leads, Body 3.00x1.63mm, Pitch 0.95mm, IPC Medium Density)
pins: D, G, S

## SMAJ5.0A-E3/61
designator D?
DIODE TVS 5VWM 9.2VC SMA; Solder: SMT; CompanyID: VT-00317; Value: SMAJ5.0A-E3/61; MPN: SMAJ5.0A-E3/61
footprint DIODE_DO214AC_SMA (Diode 2214AC)
pins: 1 A, 2 K

## SMAJ30A
designator D?
TVS DIODE 30V 48.4V DO214AC; MFR: Littelfuse Inc.; Solder: SMT; Value: SMAJ30A; MPN: SMAJ30A
footprint DIODE_DO214AC_SMA (Diode 2214AC)
pins: 1 A, 2 K

## SMCJ48CA
designator D?
TVS DIODE 48V 77.4V DO214AB; MFR: Littelfuse Inc.; Solder: SMT; Value: SMCJ48CA; MPN: SMCJ48CA; PinCount: 2
footprint DIODE_DO214AB_SMC (SMC Type)
pins: 1 A, 2 K

## SMDJ36CA
designator D?
DIODE TVS 36VWM 58.1VC 3KW SMD; CompanyID: VT-00912; Solder: SMT; Value: SMDJ36CA; MPN: SMDJ36CA
footprint DIODE_DO214AB_SMC (SMC Type)
pins: 1 A, 2 K

## SMF05CT1G
designator U?
TVS DIODE 5VWM 12.5VC SC88; CompanyID: VT-00105; Solder: SMT; MPN: SMF05CT1G; Value: SMF05CT1G
footprint SOT363 (Small Outline Transistor (SOT23), 0.65 mm pitch; 6 pin, 2.00 mm L X 1.25 mm W X 1.10 mm H body)
pins: 1 CT1, 2 AN, 3 CT2, 4 CT3, 5 CT4, 6 CT5

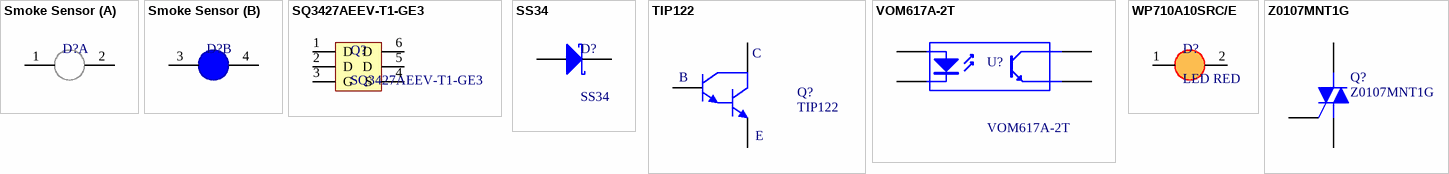
[diagram p38: symbols Smoke Sensor to Z0107MNT1G]

## Smoke Sensor
designator D?
footprint Smoke Sensor
part A pins: 1 A, 2 K
part B pins: 3 A, 4 K

## SQ3427AEEV-T1-GE3
designator Q?
MOSFET P-CH 60V 5.3A 6TSOP; Solder: SMT; CompanyID: VT-00378; Value: SQ3427AEEV-T1-GE3; MPN: SQ3427AEEV-T1-GE3
footprint TSOP-6 (TSOP, 6-Leads, Body 3.00x1.63mm, Pitch 0.95mm, IPC Medium Density)
pins: 1 D, 2 D, 3 G, 4 S, 5 D, 6 D

## SS34
designator D?
DIODE SCHOTTKY 40V 3A SMA; Solder: SMT; MPN: SS34; Value: SS34; MFR: *
footprint DIODE_DO214AC_SMA (Diode 2214AC)
pins: 1 A, 2 K

## TIP122
designator Q?
TRANS NPN DARL 100V 5A TO-220; Solder: SMT; CompanyID: VT-00411; MPN: TIP122; Value: TIP122
footprint TO220
pins: 1 B, 2 C, 3 E

## VOM617A-2T
designator U?
OPTOISOLATOR 3.75KV TRANS 4-SOP; Solder: SMT; CompanyID: VT-xxxx; MPN: VOM617A-2T; Value: VOM617A-2T
footprint OPTO TRANSISTOR_SOP-4
pins: 1, 2, 3, 4

## WP710A10SRC/E
designator D?, comment LED RED
LED RED CLEAR 3MM ROUND T/H; MPN: WP710A10SRC/E; CompanyID: VT-00176; Solder: WAVE; Value: LED RED
footprint LED_3MM-RED
pins: 1 A, 2 K

## Z0107MNT1G
designator Q?
TRIAC SENS GATE 600V 1A SOT223; Manufacturer: Littelfuse Inc.; BAPartNumber: VT-xxx; SOLD_BY: SMT; Manufacturer Part Number: Z0107MNT1G; Value: Z0107MNT1G
footprint SOT-223-4
pins: 1 M1, 2 M2, 3 G


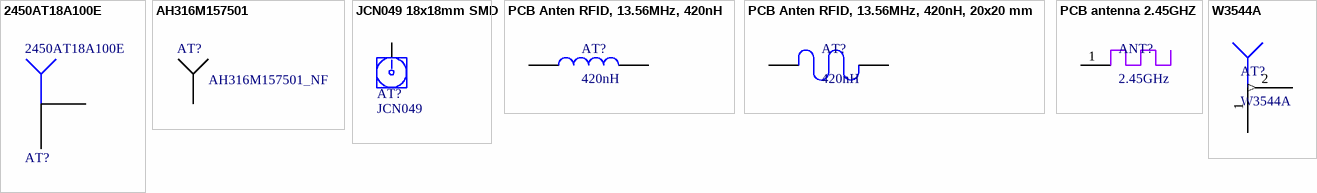
[diagram p39: symbols 2450AT18A100E to W3544A]

## 2450AT18A100E
designator AT?
ANTENNA CHIP 2.4GHz; Solder: SMT; CompanyID: VT-01165; MPN: 2450AT18A100E; Value: 2450AT18A100E
footprint SMD_4.2x1.6 (4.2x1.6mm)
pins: 1, 2

## AH316M157501
designator AT?, comment AH316M157501_NF
TAIYO YUDEN - AH316M157501 - MULTILAYER CHIP ANTENNA, 1575MHz, FULL REEL
footprint AH316 - LEFT
pins: 1

## JCN049 18x18mm SMD
designator AT?, comment JCN049
Active GPS antenna 18x18mm SMD; Solder: HAND; CompanyID: VT-01224; Value: JCN049; MPN: JCN049
footprint JCN049 18x18mm SMD
footprint JCN049 18x18mm SMD
pins: 1

## PCB Anten RFID, 13.56MHz, 420nH
designator AT?, comment 420nH  (net tie, no BOM)
PCB Anten RFID, 13.56MHz, 420nH; Solder: Not Fill; Value: 420nH
footprint PCB Anten RFID, 13.56MHz, 420nH
pins: 1, 2

## PCB Anten RFID, 13.56MHz, 420nH, 20x20 mm
designator AT?, comment 420nH  (net tie, no BOM)
PCB Anten RFID, 13.56MHz, 420nH, 20x20 mm; Solder: Not Fill; Value: 420nH
footprint PCB Anten RFID, 13.56MHz, 420nH, 20x20 mm
pins: 1, 2

## PCB antenna 2.45GHZ
designator ANT?, comment 2.45GHz
PCB ANTENNA 2.45GHZ; Value: 2.45GHz
footprint PATCH ANTEN 2.45GHZ
pins: 1 ANT

## W3544A
designator AT?
ANTENNA PENTABAND HYBRID GSM/3G; Solder: SMT; CompanyID: VT-01143; MPN: W3544A; Value: W3544A
footprint W3544A
pins: 1, 2 (out)